# Altium footprint library Разъемы.PcbLib: 291 footprints (part 1 of 19)
Each footprint in its own frame and in the unit in brackets; x right, y up, seen from the top. Pads: shape width x height; smd on the part's side, far side on the other; paste and mask are expansions set on the pad; w line width, h text height; cw(c..) or ccw(c..) is an arc to the next point about the centre after c.
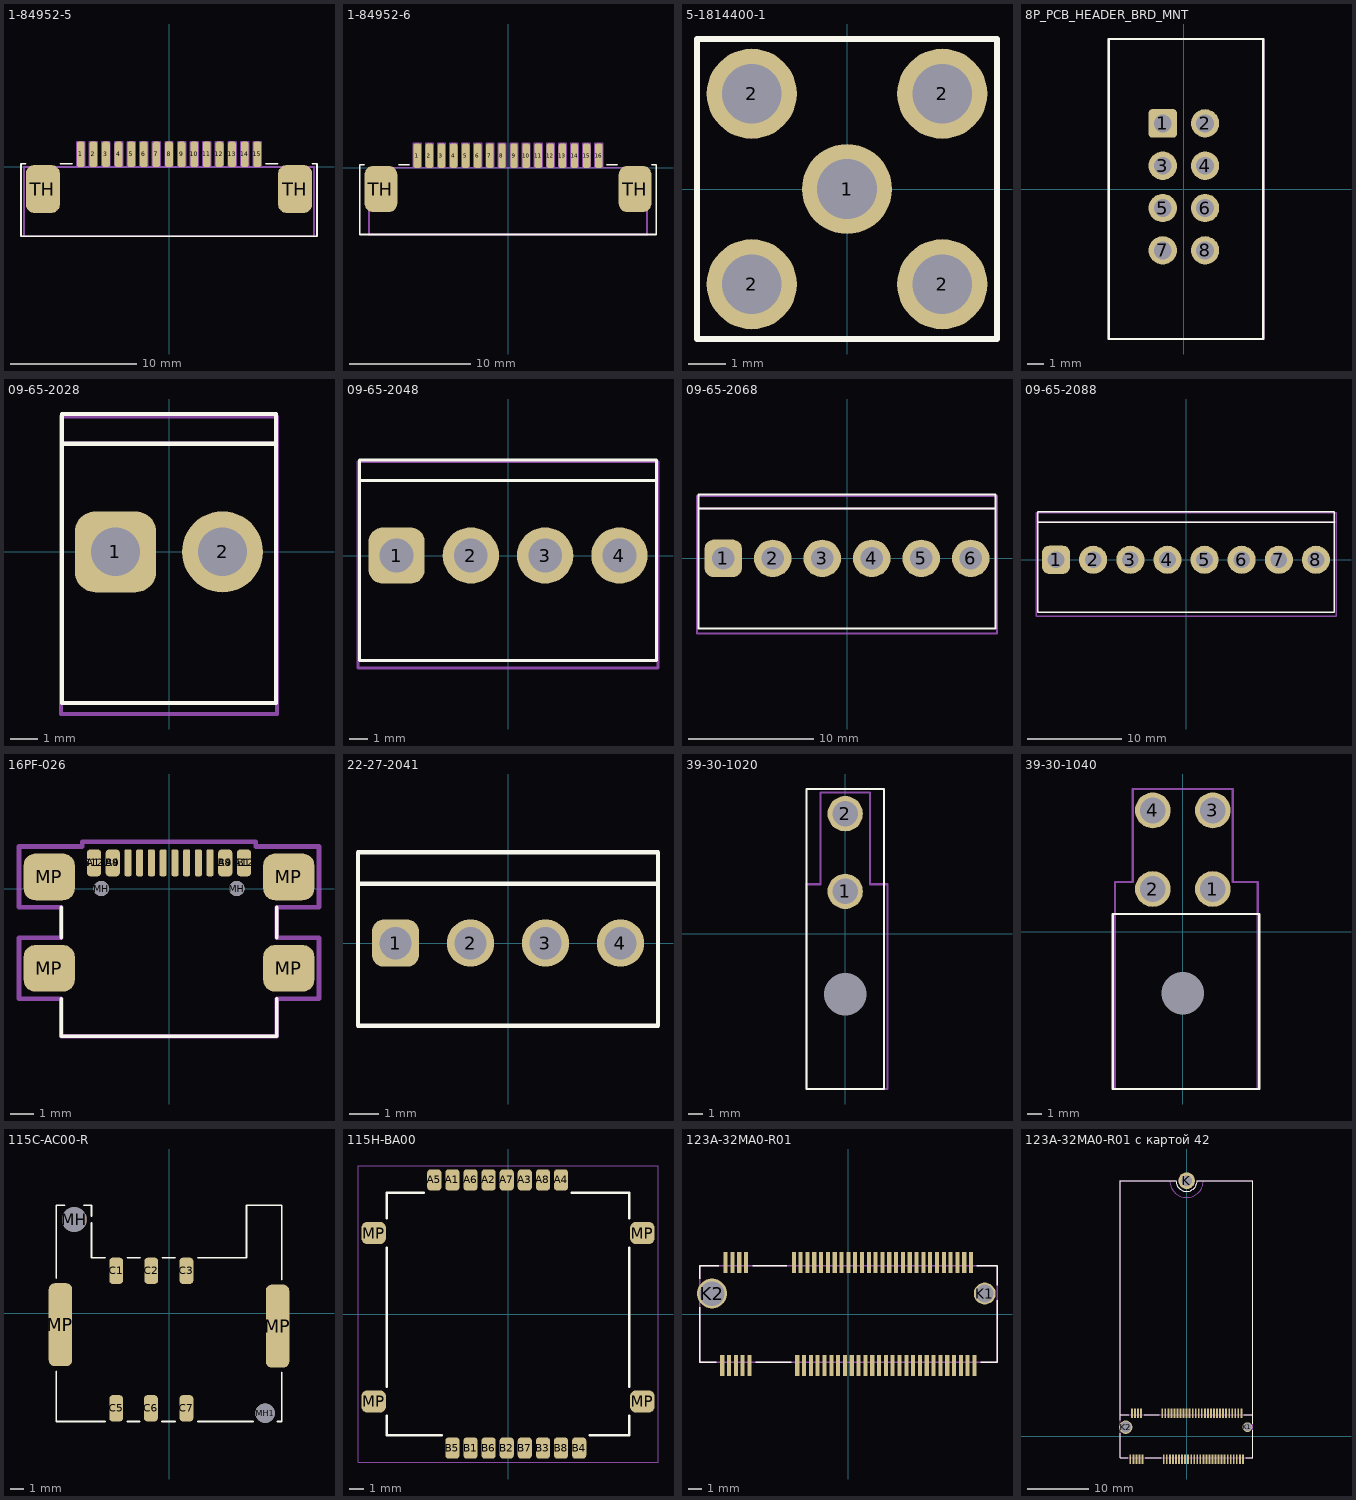
[diagram p0: the footprints below, top view; thin cyan lines are the x and y axes]

## 1-84952-5 [mm]
height 2.6
pads (17):
  rrect50% 0.61x2 smd: 1(-7,1) 2(-6,1) 3(-5,1) 4(-4,1) 5(-3,1) 6(-2,1) 7(-1,1) 8(0,1) 9(1,1) 10(2,1) 11(3,1) 12(4,1) 13(5,1) 14(6,1) 15(7,1)
  rrect50% 2.7x3.8 smd: TH(-10,-1.75) TH(10,-1.75)
Top Overlay:
  lines w0.15: -11.386,0.25 -11.75,0.25 -11.75,-5.5 0.5,-5.5 11.75,-5.5 11.75,-3.75 11.75,0.25 11.386,0.25 ; -8.614,0.25 -7.682,0.25 ; 8.5,0.25 7.682,0.25 8.614,0.25
  text "." at -8,1.25 h0.1
Mechanical 29:
  lines w0.15: -7.3,0 -7.3,2 -6.7,2 -6.7,0 ; -6.3,0 -6.3,2 -5.7,2 -5.7,0 ; -5.3,0 -5.3,2 -4.7,2 -4.7,0 ; -4.3,0 -4.3,2 -3.7,2 -3.7,0 ; -3.3,0 -3.3,2 -2.7,2 -2.7,0 ; -2.3,0 -2.3,2 -1.7,2 -1.7,0 ; -1.3,0 -1.3,2 -0.7,2 -0.7,0 ; -0.3,0 -0.3,2 0.3,2 0.3,0 ; 0.7,0 0.7,2 1.3,2 1.3,0 ; 1.7,0 1.7,2 2.3,2 2.3,0 ; 2.7,0 2.7,2 3.3,2 3.3,0 ; 3.7,0 3.7,2 4.3,2 4.3,0 ; 4.7,0 4.7,2 5.3,2 5.3,0 ; 5.7,0 5.7,2 6.3,2 6.3,0 ; 6.7,0 6.7,2 7.3,2 7.3,0 ; -11.5,-5.5 -11.5,0 11.5,0 11.5,-5.5 -11.5,-5.5

## 1-84952-6 [mm]
height 2.6
pads (18):
  rrect50% 0.61x2 smd: 1(-7.5,1) 2(-6.5,1) 3(-5.5,1) 4(-4.5,1) 5(-3.5,1) 6(-2.5,1) 7(-1.5,1) 8(-0.5,1) 9(0.5,1) 10(1.5,1) 11(2.5,1) 12(3.5,1) 13(4.5,1) 14(5.5,1) 15(6.5,1) 16(7.5,1)
  rrect50% 2.7x3.8 smd: TH(-10.5,-1.75) TH(10.5,-1.75)
Top Overlay:
  lines w0.15: -11.886,0.25 -12.25,0.25 -12.25,-3.75 -12.25,-5.5 0.5,-5.5 12.25,-5.5 12.25,-3.75 12.25,0.25 11.886,0.25 ; -9,0.25 -8.182,0.25 ; 8.182,0.25 9,0.25
  text "." at -8.25,2.25 h0.1
Mechanical 29:
  lines w0.15: -7.8,0 -7.8,2 -7.2,2 -7.2,0 ; -6.8,0 -6.8,2 -6.2,2 -6.2,0 ; -5.8,0 -5.8,2 -5.2,2 -5.2,0 ; -4.8,0 -4.8,2 -4.2,2 -4.2,0 ; -3.8,0 -3.8,2 -3.2,2 -3.2,0 ; -2.8,0 -2.8,2 -2.2,2 -2.2,0 ; -1.8,0 -1.8,2 -1.2,2 -1.2,0 ; -0.8,0 -0.8,2 -0.2,2 -0.2,0 ; 0.2,0 0.2,2 0.8,2 0.8,0 ; 1.2,0 1.2,2 1.8,2 1.8,0 ; 2.2,0 2.2,2 2.8,2 2.8,0 ; 3.2,0 3.2,2 3.8,2 3.8,0 ; 4.2,0 4.2,2 4.8,2 4.8,0 ; 5.2,0 5.2,2 5.8,2 5.8,0 ; 6.2,0 6.2,2 6.8,2 6.8,0 ; 7.2,0 7.2,2 7.8,2 7.8,0 ; -11.5,-5.5 11.5,-5.5 11.5,0 -11.5,0 -11.5,-5.5

## 5-1814400-1 [mm] "TE, SMA Connector Jack, Female Socket 50 Ohm Through Hole, Right Angle Solder"
height 10.43
pads (5):
  round 2.4 hole 1.6: 1(0,0) 2(-2.54,-2.54) 2(-2.54,2.54) 2(2.54,-2.54) 2(2.54,2.54)
Top Overlay:
  lines w0.15: -4,-4 4,-4 4,4 -4,4 -4,-4
3D body "c-5-1814400-1-d-3d.stp": height 10.43, standoff -3.1, extent -3.163,-11.05 3.164,3.15

## 8P_PCB_HEADER_BRD_MNT [mm] "HEADER BRD MNT 8POS 2.54MM"
height 10
pads (8):
  rrect25% 1.7x1.7 hole 1.067: 1(-1.27,3.937)
  round 1.7 hole 1.067: 2(1.27,3.937) 3(-1.27,1.397) 4(1.27,1.397) 5(-1.27,-1.143) 6(1.27,-1.143) 7(-1.27,-3.683) 8(1.27,-3.683)
Top Overlay:
  lines w0.15: -4.5,-9 -4.5,9 4.75,9 4.75,-9 -4.5,-9
  text "." at -5,5.5 h0.1
Top Courtyard:
  lines w0.15: -4.5,-9 -4.5,9 4.75,9 4.75,-9 -4.5,-9
Mechanical 29:
  circle w0.15: c-1.27,3.937 r0.554
  circle w0.15: c1.27,3.937 r0.554
  circle w0.15: c-1.27,1.397 r0.554
  circle w0.15: c1.27,1.397 r0.554
  circle w0.15: c1.27,-1.143 r0.554
  circle w0.15: c1.27,-3.683 r0.554
  circle w0.15: c-1.27,-3.683 r0.554
  circle w0.15: c-1.27,-1.143 r0.554
  circle w0.15: c-1.27,1.397 r0.554
3D body "User Library-8 pin IDC shrouded header V2.step": height 9.18, standoff -2.97, extent -4.475,-8.89 4.725,8.89

## 09-65-2028 [mm]
pads (2):
  rrect50% 3x3 hole 1.8: 1(-1.98,0)
  round 3 hole 1.8: 2(1.98,0)
Top Overlay:
  lines w0.15: -3.96,4 3.96,4 ; -3.96,-5.6 3.96,-5.6 3.96,5.1 -3.96,5.1 -3.96,-5.6
  text "." at -2.5,-6.5 h0.1
Mechanical 29:
  lines w0.15: -4,4 4,4 ; -4,-6 -4,5 4,5 4,-6 -4,-6
3D body "009652028.stp": height 13.85, standoff -3.6, extent -3.58,-5.6 3.58,5.15

## 09-65-2048 [mm]
height 12
pads (4):
  rrect50% 3x3 hole 1.8: 1(-5.94,0)
  round 3 hole 1.8: 2(-1.98,0) 3(1.98,0) 4(5.94,0)
Top Overlay:
  lines w0.15: -7.92,4 7.92,4 ; -7.92,-5.6 7.92,-5.6 7.92,5.1 -7.92,5.1 -7.92,-5.6
  text "." at -6.25,-6.5 h0.1
Mechanical 29:
  lines w0.15: 8,4 -8,4 -8,5 ; -8,5 8,5 8,-6 -8,-6 -8,5
3D body "009652048.stp": height 13.85, standoff -3.6, extent -7.515,-5.6 7.565,5.15

## 09-65-2068 [mm]
pads (6):
  rrect50% 3x3 hole 1.8: 1(-9.9,0)
  round 3 hole 1.8: 2(-5.94,0) 3(-1.98,0) 4(1.98,0) 5(5.94,0) 6(9.9,0)
Top Overlay:
  lines w0.15: -11.88,4 11.88,4 ; -11.88,-5.6 -11.88,5.1 11.88,5.1 11.88,-5.6 -11.88,-5.6
  text "." at -10,-6.5 h0.1
Mechanical 29:
  lines w0.15: 12,4 -12,4 -12,5 ; -12,5 -12,-6 12,-6 12,5 -12,5
3D body "009652068.stp": height 13.85, standoff -3.6, extent -11.5,-5.6 11.5,5.15

## 09-65-2088 [mm]
pads (8):
  rrect50% 3x3 hole 1.8: 1(-13.86,0)
  round 3 hole 1.8: 2(-9.9,0) 3(-5.94,0) 4(-1.98,0) 5(1.98,0) 6(5.94,0) 7(9.9,0) 8(13.86,0)
Top Overlay:
  lines w0.15: -15.84,4 15.84,4 ; -15.84,-5.6 15.84,-5.6 15.84,5.1 -15.84,5.1 -15.84,-5.6
  text "." at -13.75,-6.5 h0.1
Mechanical 29:
  lines w0.15: 16,4 -16,4 -16,5 ; -16,5 16,5 16,-6 -16,-6 -16,5
3D body "009652088.stp": height 13.85, standoff -3.6, extent -15.46,-5.6 15.46,5.15

## 16PF-026 [mm]
pads (22):
  rrect50% 0.6x1.15 smd: A1(-3.2,1.1) A4(-2.4,1.1) A9(2.4,1.1) A12(3.2,1.1) B1(3.2,1.1) B4(2.4,1.1) B9(-2.4,1.1) B12(-3.2,1.1)
  rrect50% 0.3x1.15 smd: A5(-1.25,1.1) A6(-0.25,1.1) A7(0.25,1.1) A8(1.25,1.1) B5(1.75,1.1) B6(0.75,1.1) B7(-0.75,1.1) B8(-1.75,1.1)
  round 0.65 hole 0.65 unplated: MH(-2.89,0) MH(2.89,0)
  rrect50% 2.18x2 smd: MP(-5.11,-3.4) MP(-5.11,0.5) MP(5.11,-3.4) MP(5.11,0.5)
Top Overlay:
  lines w0.15: -4.6,-4.7 -4.6,-6.3 4.6,-6.3 4.6,-4.7 ; -4.6,-2.1 -4.6,-0.8 ; 4.6,-2.1 4.6,-0.8
  text "." at -4.452,1.598 h1.1
Top Courtyard:
  lines w0.2: -6.4,-4.7 -4.6,-4.7 -4.6,-6.3 0,-6.3 4.6,-6.3 4.6,-4.7 6.4,-4.7 6.4,-2.1 4.6,-2.1 4.6,-0.8 6.4,-0.8 6.4,1.8 3.7,1.8 3.7,2 0,2 -3.7,2 -3.7,1.8 -6.4,1.8 -6.4,-0.8 -4.6,-0.8 -4.6,-2.1 -6.4,-2.1 -6.4,-4.7
3D body "USB4110-GF-A--3DModel-STEP-56544.STEP": height 3.24, standoff -0.72, extent -5.65,-6.3 5.65,1.38

## 22-27-2041 [mm]
pads (4):
  rrect50% 1.6x1.6 hole 1.1: 1(-3.81,0)
  round 1.6 hole 1.1: 2(-1.27,0) 3(1.27,0) 4(3.81,0)
Top Overlay:
  lines w0.15: -5.08,2.012 5.08,2.012 ; -5.08,-2.8 5.08,-2.8 5.08,3.075 -5.08,3.075 -5.08,-2.8
  text "." at -4,-3.25 h0.1
3D body "022272041.stp": height 11.72, standoff -3.54, extent -5.105,-2.825 5.055,2.975

## 39-30-1020 [mm] "Mini-Fit Jr.пїЅ Header, Dual Row, Right Angle, with Snap-in Plastic Peg PCB Lock, 2 Circuits, PA Polyamide Nylon 6/6 94V-2, Tin (Sn) Plating"
height 9.6
pads (3):
  round 2.5 hole 1.8: 1(0,3) 2(0,8.5)
  round 0 hole 3 unplated: MTB(0,-4.3)
Top Overlay:
  lines w0.15: -2.75,-11 -2.75,10.25 2.75,10.25 2.75,-11 -2.75,-11
Top Courtyard:
  lines w0.15: -2.75,-11 -2.75,3.5 -1.75,3.5 -1.75,10 0,10 1.75,10 1.75,3.5 3,3.5 3,-11 0,-11 -2.75,-11
3D body "39-30-1020.stp": height 11.4, standoff -3.6, extent -2.75,-10.912 3.05,9.023

## 39-30-1040 [mm] "Mini-Fit Jr.пїЅ Header, Dual Row, Right Angle, with Snap-in Plastic Peg PCB Lock, 4 Circuits, PA Polyamide Nylon 6/6 94V-2, Tin (Sn) Plating"
height 9.6
pads (5):
  round 2.5 hole 1.8: 1(2.1,3) 2(-2.1,3) 3(2.1,8.5) 4(-2.1,8.5)
  round 0 hole 3 unplated: MTB(0,-4.3)
Top Overlay:
  lines w0.15: -4.9,-11 5.35,-11 5.35,1.25 -4.9,1.25 -4.9,-11
  text "." at 4.25,2.75 h0.1
Top Courtyard:
  lines w0.15: -4.75,-11 0,-11 5.25,-11 5.25,3.5 3.5,3.5 3.5,10 0,10 -3.5,10 -3.5,3.5 -4.75,3.5 -4.75,-11
3D body "039301040.stp": height 11.4, standoff -3.6, extent -4.8,-10.9 5.2,9.035

## 115C-AC00-R [mm]
pads (10):
  rrect50% 1x1.9 smd: C1(-3.82,3.075) C2(-1.28,3.075) C3(1.26,3.075) C5(-3.82,-6.875) C6(-1.31,-6.875) C7(1.26,-6.875)
  round 1.8 hole 1.8 unplated: MH(-6.85,6.775)
  round 1.4 hole 1.4 unplated: MH1(6.95,-7.225)
  rrect50% 1.7x6 smd: MP(-7.85,-0.825) MP(7.85,-0.925)
Top Overlay:
  lines w0.127: -8.15,-4.19 -8.15,-7.825 -4.632,-7.825 ; -8.15,2.54 -8.15,4.025 -8.15,7.825 -7.556,7.825 ; -6.144,7.825 -5.61,7.825 -5.61,7.026 ; -5.61,6.524 -5.61,4.025 -4.632,4.025 ; -3.008,-7.825 -2.122,-7.825 ; -3.008,4.025 -2.092,4.025 ; -0.498,-7.825 0.448,-7.825 ; -0.468,4.025 0.448,4.025 ; 2.072,-7.825 6.07,-7.825 ; 2.072,4.025 5.61,4.025 5.61,7.825 8.15,7.825 8.15,4.025 8.15,2.44 ; 7.83,-7.825 8.15,-7.825 8.15,-4.29
3D body "115c-ac00-01_C.stp": height 2.6, standoff -1, extent -8.15,-11.525 8.25,7.875

## 115H-BA00 [mm]
pads (20):
  rrect50% 1x1.5 smd: A1(-3.9,9.4) A2(-1.36,9.4) A3(1.18,9.4) A4(3.72,9.4) A5(-5.17,9.4) A6(-2.63,9.4) A7(-0.09,9.4) A8(2.45,9.4) B1(-2.63,-9.4) B2(-0.09,-9.4) B3(2.45,-9.4) B4(4.99,-9.4) B5(-3.9,-9.4) B6(-1.36,-9.4) B7(1.18,-9.4) B8(3.72,-9.4)
  rrect50% 1.7x1.55 smd: MP(-9.42,-6.13) MP(-9.42,5.68) MP(9.42,-6.13) MP(9.42,5.68)
Top Overlay:
  lines w0.2: -8.5,-7.16 -8.5,-8.5 -4.664,-8.5 ; -8.5,-5.1 -8.5,4.65 ; -8.5,6.71 -8.5,8.5 -5.934,8.5 ; 4.484,8.5 8.5,8.5 8.5,6.71 ; 5.754,-8.5 8.5,-8.5 8.5,-7.16 ; 8.5,-5.1 8.5,4.65
Top Courtyard:
  lines w0.05: -10.52,-10.4 10.52,-10.4 10.52,10.4 -10.52,10.4 -10.52,-10.4
3D body "sim6050-8-0-30-00-a_revb.step": height 2.98, standoff -0.02, extent -9.65,-9.75 9.65,9.75

## 123A-32MA0-R01 [mm]
height 3
pads (66):
  rect 0.3x1.55 smd: 1(9.25,-3.775) 1(9.25,-3.775) 2(9,3.775) 3(8.75,-3.775) 4(8.5,3.775) 5(8.25,-3.775) 6(8,3.775) 7(7.75,-3.775) 8(7.5,3.775) 9(7.25,-3.775) 10(7,3.775) 11(6.75,-3.775) 12(6.5,3.775) 13(6.25,-3.775) 14(6,3.775) 15(5.75,-3.775) 16(5.5,3.775) 17(5.25,-3.775) 18(5,3.775) 19(4.75,-3.775) 20(4.5,3.775) 21(4.25,-3.775) 22(4,3.775) 23(3.75,-3.775) 24(3.5,3.775) 25(3.25,-3.775) 26(3,3.775) 27(2.75,-3.775) 28(2.5,3.775) 29(2.25,-3.775) 30(2,3.775) 31(1.75,-3.775) 32(1.5,3.775) 33(1.25,-3.775) 34(1,3.775) 35(0.75,-3.775) 36(0.5,3.775) 37(0.25,-3.775) 38(0,3.775) 39(-0.25,-3.775) 40(-0.5,3.775) 41(-0.75,-3.775) 42(-1,3.775) 43(-1.25,-3.775) 44(-1.5,3.775) 45(-1.75,-3.775) 46(-2,3.775) 47(-2.25,-3.775) 48(-2.5,3.775) 49(-2.75,-3.775) 50(-3,3.775) 51(-3.25,-3.775) 52(-3.5,3.775) 53(-3.75,-3.775) 54(-4,3.775) 67(-7.25,-3.775) 68(-7.5,3.775) 69(-7.75,-3.775) 70(-8,3.775) 71(-8.25,-3.775) 72(-8.5,3.775) 73(-8.75,-3.775) 74(-9,3.775) 75(-9.25,-3.775)
  round 1.6 hole 1.3: K1(10,1.5)
  round 2.2 hole 1.8: K2(-10,1.5)
Top Overlay:
  lines w0.1: -10.9,0.5 -10.9,-3.55 -9.7,-3.55 ; -10.9,2.6 -10.9,3.55 -9.5,3.55 ; -7,3.55 -4.5,3.55 ; -6.8,-3.55 -4.2,-3.55 ; 9.4,3.55 10.9,3.55 10.9,2.1 ; 9.7,-3.55 10.9,-3.55 10.9,1
Mechanical 1:
  lines w0.1: -10.9,-3.55 -10.9,3.55 10.9,3.55 10.9,-3.55 -10.9,-3.55

## 123A-32MA0-R01 с картой 42 [mm]
height 3
pads (67):
  rect 0.3x1.55 smd: 1(9.25,-3.775) 1(9.25,-3.775) 2(9,3.775) 3(8.75,-3.775) 4(8.5,3.775) 5(8.25,-3.775) 6(8,3.775) 7(7.75,-3.775) 8(7.5,3.775) 9(7.25,-3.775) 10(7,3.775) 11(6.75,-3.775) 12(6.5,3.775) 13(6.25,-3.775) 14(6,3.775) 15(5.75,-3.775) 16(5.5,3.775) 17(5.25,-3.775) 18(5,3.775) 19(4.75,-3.775) 20(4.5,3.775) 21(4.25,-3.775) 22(4,3.775) 23(3.75,-3.775) 24(3.5,3.775) 25(3.25,-3.775) 26(3,3.775) 27(2.75,-3.775) 28(2.5,3.775) 29(2.25,-3.775) 30(2,3.775) 31(1.75,-3.775) 32(1.5,3.775) 33(1.25,-3.775) 34(1,3.775) 35(0.75,-3.775) 36(0.5,3.775) 37(0.25,-3.775) 38(0,3.775) 39(-0.25,-3.775) 40(-0.5,3.775) 41(-0.75,-3.775) 42(-1,3.775) 43(-1.25,-3.775) 44(-1.5,3.775) 45(-1.75,-3.775) 46(-2,3.775) 47(-2.25,-3.775) 48(-2.5,3.775) 49(-2.75,-3.775) 50(-3,3.775) 51(-3.25,-3.775) 52(-3.5,3.775) 53(-3.75,-3.775) 54(-4,3.775) 67(-7.25,-3.775) 68(-7.5,3.775) 69(-7.75,-3.775) 70(-8,3.775) 71(-8.25,-3.775) 72(-8.5,3.775) 73(-8.75,-3.775) 74(-9,3.775) 75(-9.25,-3.775)
  round 2.75 hole 1.75: K(0,42)
  round 1.6 hole 1.3: K1(10,1.5)
  round 2.2 hole 1.8: K2(-10,1.5)
Top Overlay:
  lines w0.1: -10.9,0.5 -10.9,-3.55 -9.7,-3.55 ; -10.9,2.6 -10.9,3.55 ; -9.5,3.55 -10.9,3.55 ; -7,3.55 -4.5,3.55 ; -6.8,-3.55 -4.2,-3.55 ; 9.4,3.55 10.9,3.55 ; 9.7,-3.55 10.9,-3.55 10.9,1 ; 10.9,2.1 10.9,3.55 ; -10.9,3.55 -10.9,42 -1.75,42 ccw(c0,42) 1.75,42 10.9,42 10.9,3.55
Mechanical 1:
  lines w0.1: -2.75,42 ccw(c0,42) 2.75,42 ; -10.9,3.55 -10.9,42 -1.75,42 ccw(c0,42) 1.75,42 10.9,42 10.9,3.55 ; -10.9,3.55 -10.9,-3.55 10.9,-3.55 10.9,3.55 ; -10.9,3.55 10.9,3.55